# Altium schematic symbol library Capacitor - Aluminium TH.SchLib: 4591 symbols (part 14 of 27) (continued)
## UBT1C471MPD1TD (continued)
CAP ALUM 470UF 20% 16V RADIAL; Part Number: UBT1C471MPD1TD; Manufacturer: Nichicon; TemperatureRange: -40C ~ 125C; Type: Polar; Ripple Current: 472.5mA @ 120Hz; Impedance: 75 mOhm; Value: 470uF; PartId: 25469; Supplier 1: Digi-Key; Supplier Part Number 1: 493-4493-3-ND; ComponentLink1Description: Datasheet; ComponentLink1URL: http://nichicon-us.com/english/products/pdfs/e-ubt.pdf; ComponentLink2Description: Digi-Key Listing; ComponentLink2URL: https://www.digikey.com/product-detail/en/nichicon/UBT1C471MPD1TD/493-4493-3-ND/2649081; Tolerance: 20%; Voltage: 16V; Price: 0.2861; Device Package: Radial, Can, 10mm
footprint CAP AL TH D10 L5 H22
pins: 1, 2

## UBT1E102MHD1TO
designator C?, comment 1000uF  (value not drawn)
CAP ALUM 1000UF 20% 25V RADIAL; Part Number: UBT1E102MHD1TO; Manufacturer: Nichicon; TemperatureRange: -40C ~ 125C; Type: Polar; Ripple Current: 1.172A @ 120Hz; Impedance: 33 mOhm; Value: 1000uF; PartId: 23847; Supplier 1: Digi-Key; Supplier Part Number 1: 493-4500-3-ND; ComponentLink1Description: Datasheet; ComponentLink1URL: http://nichicon-us.com/english/products/pdfs/e-ubt.pdf; ComponentLink2Description: Digi-Key Listing; ComponentLink2URL: https://www.digikey.com/product-detail/en/nichicon/UBT1E102MHD1TO/493-4500-3-ND/2649088; Tolerance: 20%; Voltage: 25V; Price: 0.5684; Device Package: Radial, Can, 12.5mm
footprint CAP AL TH D12.5 L5 H27
pins: 1, 2

## UBT1E222MHD
designator C?, comment 2200uF  (value not drawn)
CAP ALUM 2200UF 20% 25V RADIAL; Part Number: UBT1E222MHD; Manufacturer: Nichicon; TemperatureRange: -40C ~ 125C; Type: Polar; Ripple Current: 1.816A @ 120Hz; Impedance: 20 mOhm; Value: 2200uF; PartId: 27192; Supplier 1: Digi-Key; Supplier Part Number 1: 493-4484-ND; ComponentLink1Description: Datasheet; ComponentLink1URL: http://nichicon-us.com/english/products/pdfs/e-ubt.pdf; ComponentLink2Description: Digi-Key Listing; ComponentLink2URL: https://www.digikey.com/product-detail/en/nichicon/UBT1E222MHD/493-4484-ND/2597401; Tolerance: 20%; Voltage: 25V; Price: 2.05; Device Package: Radial, Can, 16mm
footprint CAP AL TH D16 L7.5 H33.5
pins: 1, 2

## UBT1E331MPD1TD
designator C?, comment 330uF  (value not drawn)
CAP ALUM 330UF 20% 25V RADIAL; Part Number: UBT1E331MPD1TD; Manufacturer: Nichicon; TemperatureRange: -40C ~ 125C; Type: Polar; Ripple Current: 472.5mA @ 120Hz; Impedance: 75 mOhm; Value: 330uF; PartId: 25467; Supplier 1: Digi-Key; Supplier Part Number 1: 493-4498-3-ND; ComponentLink1Description: Datasheet; ComponentLink1URL: http://nichicon-us.com/english/products/pdfs/e-ubt.pdf; ComponentLink2Description: Digi-Key Listing; ComponentLink2URL: https://www.digikey.com/product-detail/en/nichicon/UBT1E331MPD1TD/493-4498-3-ND/2649086; Tolerance: 20%; Voltage: 25V; Price: 0.2698; Device Package: Radial, Can, 10mm
footprint CAP AL TH D10 L5 H22
pins: 1, 2

## UBT1E471MPD1TD
designator C?, comment 470uF  (value not drawn)
CAP ALUM 470UF 20% 25V RADIAL; Part Number: UBT1E471MPD1TD; Manufacturer: Nichicon; TemperatureRange: -40C ~ 125C; Type: Polar; Ripple Current: 550mA @ 120Hz; Impedance: 57 mOhm; Value: 470uF; PartId: 25813; Supplier 1: Digi-Key; Supplier Part Number 1: 493-4499-3-ND; ComponentLink1Description: Datasheet; ComponentLink1URL: http://nichicon-us.com/english/products/pdfs/e-ubt.pdf; ComponentLink2Description: Digi-Key Listing; ComponentLink2URL: https://www.digikey.com/product-detail/en/nichicon/UBT1E471MPD1TD/493-4499-3-ND/2649087; Tolerance: 20%; Voltage: 25V; Price: 0.3319; Device Package: Radial, Can, 10mm
footprint CAP AL TH D10 L5 H22
pins: 1, 2

## UBT1H101MPD1TD
designator C?, comment 100uF  (value not drawn)
CAP ALUM 100UF 20% 50V RADIAL; Part Number: UBT1H101MPD1TD; Manufacturer: Nichicon; TemperatureRange: -40C ~ 125C; Type: Polar; Ripple Current: 277.5mA @ 120Hz; Impedance: 180 mOhm; Value: 100uF; PartId: 24652; Supplier 1: Digi-Key; Supplier Part Number 1: 493-4508-3-ND; ComponentLink1Description: Datasheet; ComponentLink1URL: http://nichicon-us.com/english/products/pdfs/e-ubt.pdf; ComponentLink2Description: Digi-Key Listing; ComponentLink2URL: https://www.digikey.com/product-detail/en/nichicon/UBT1H101MPD1TD/493-4508-3-ND/2649096; Tolerance: 20%; Voltage: 50V; Price: 0.2558; Device Package: Radial, Can, 10mm
footprint CAP AL TH D10 L5 H14.5
pins: 1, 2

## UBT1H221MPD
designator C?, comment 220uF  (value not drawn)
CAP ALUM 220UF 20% 50V RADIAL; Part Number: UBT1H221MPD; Manufacturer: Nichicon; TemperatureRange: -40C ~ 125C; Type: Polar; Ripple Current: 465mA @ 120Hz; Impedance: 98 mOhm; Value: 220uF; PartId: 25962; Supplier 1: Digi-Key; Supplier Part Number 1: 493-13385-ND; ComponentLink1Description: Datasheet; ComponentLink1URL: http://nichicon-us.com/english/products/pdfs/e-ubt.pdf; ComponentLink2Description: Digi-Key Listing; ComponentLink2URL: https://www.digikey.com/product-detail/en/nichicon/UBT1H221MPD/493-13385-ND/2597410; Tolerance: 20%; Voltage: 50V; Price: 0.83; Device Package: Radial, Can, 10mm
footprint CAP AL TH D10 L5 H22
pins: 1, 2

## UBT1H221MPD1TD
designator C?, comment 220uF  (value not drawn)
CAP ALUM 220UF 20% 50V RADIAL; Part Number: UBT1H221MPD1TD; Manufacturer: Nichicon; TemperatureRange: -40C ~ 125C; Type: Polar; Ripple Current: 465mA @ 120Hz; Impedance: 98 mOhm; Value: 220uF; PartId: 25828; Supplier 1: Digi-Key; Supplier Part Number 1: 493-13101-3-ND; ComponentLink1Description: Datasheet; ComponentLink1URL: http://nichicon-us.com/english/products/pdfs/e-ubt.pdf; ComponentLink2Description: Digi-Key Listing; ComponentLink2URL: https://www.digikey.com/product-detail/en/nichicon/UBT1H221MPD1TD/493-13101-3-ND/4332732; Tolerance: 20%; Voltage: 50V; Price: 0.3475; Device Package: Radial, Can, 10mm
footprint CAP AL TH D10 L5 H22
pins: 1, 2

## UBT1H331MHD
designator C?, comment 330uF  (value not drawn)
CAP ALUM 330UF 20% 50V RADIAL; Part Number: UBT1H331MHD; Manufacturer: Nichicon; TemperatureRange: -40C ~ 125C; Type: Polar; Ripple Current: 665mA @ 120Hz; Impedance: 70 mOhm; Value: 330uF; PartId: 23403; Supplier 1: Digi-Key; Supplier Part Number 1: 493-14457-ND; ComponentLink1Description: Datasheet; ComponentLink1URL: http://nichicon-us.com/english/products/pdfs/e-ubt.pdf; ComponentLink2Description: Digi-Key Listing; ComponentLink2URL: https://www.digikey.com/product-detail/en/nichicon/UBT1H331MHD/493-14457-ND/2597412; Tolerance: 20%; Voltage: 50V; Price: 0.98; Device Package: Radial, Can, 12.5mm
footprint CAP AL TH D12.5 L5 H22
pins: 1, 2

## UBT1H331MHD1TO
designator C?, comment 330uF  (value not drawn)
CAP ALUM 330UF 20% 50V RADIAL; Part Number: UBT1H331MHD1TO; Manufacturer: Nichicon; TemperatureRange: -40C ~ 125C; Type: Polar; Ripple Current: 665mA @ 120Hz; Impedance: 70 mOhm; Value: 330uF; PartId: 23188; Supplier 1: Digi-Key; Supplier Part Number 1: 493-4509-3-ND; ComponentLink1Description: Datasheet; ComponentLink1URL: http://nichicon-us.com/english/products/pdfs/e-ubt.pdf; ComponentLink2Description: Digi-Key Listing; ComponentLink2URL: https://www.digikey.com/product-detail/en/nichicon/UBT1H331MHD1TO/493-4509-3-ND/2649097; Tolerance: 20%; Voltage: 50V; Price: 0.4367; Device Package: Radial, Can, 12.5mm
footprint CAP AL TH D12.5 L5 H22
pins: 1, 2

## UBT1H471MHD1TO
designator C?, comment 470uF  (value not drawn)
CAP ALUM 470UF 20% 50V RADIAL; Part Number: UBT1H471MHD1TO; Manufacturer: Nichicon; TemperatureRange: -40C ~ 125C; Type: Polar; Ripple Current: 825mA @ 120Hz; Impedance: 55 mOhm; Value: 470uF; PartId: 23858; Supplier 1: Digi-Key; Supplier Part Number 1: 493-4510-3-ND; ComponentLink1Description: Datasheet; ComponentLink1URL: http://nichicon-us.com/english/products/pdfs/e-ubt.pdf; ComponentLink2Description: Digi-Key Listing; ComponentLink2URL: https://www.digikey.com/product-detail/en/nichicon/UBT1H471MHD1TO/493-4510-3-ND/2649098; Tolerance: 20%; Voltage: 50V; Price: 0.6509; Device Package: Radial, Can, 12.5mm
footprint CAP AL TH D12.5 L5 H27
pins: 1, 2

## UBT1H471MNYGNACV
designator C?, comment 470uF  (value not drawn)
CAP ALUM 470UF 20% 50V RADIAL; Part Number: UBT1H471MNYGNACV; Manufacturer: Nichicon; TemperatureRange: -40C ~ 125C; Type: Polar; Ripple Current: 825mA @ 120Hz; Impedance: 55 mOhm; Value: 470uF; PartId: 24120; Supplier 1: Digi-Key; Supplier Part Number 1: UBT1H471MNYGNACV-ND; ComponentLink1Description: Datasheet; ComponentLink1URL: http://nichicon-us.com/english/products/pdfs/e-ubt.pdf; ComponentLink2Description: Digi-Key Listing; ComponentLink2URL: https://www.digikey.com/product-detail/en/nichicon/UBT1H471MNYGNACV/UBT1H471MNYGNACV-ND/5080522; Tolerance: 20%; Voltage: 50V; Price: 1.41; Device Package: Radial, Can, 12.5mm
footprint CAP AL TH D12.5 L5 H27
pins: 1, 2

## UBT1J101MPD1TD
designator C?, comment 100uF  (value not drawn)
CAP ALUM 100UF 20% 63V RADIAL; Part Number: UBT1J101MPD1TD; Manufacturer: Nichicon; TemperatureRange: -40C ~ 125C; Type: Polar; Ripple Current: 345mA @ 120Hz; Impedance: 410 mOhm; Value: 100uF; PartId: 25475; Supplier 1: Digi-Key; Supplier Part Number 1: 493-13105-3-ND; ComponentLink1Description: Datasheet; ComponentLink1URL: http://nichicon-us.com/english/products/pdfs/e-ubt.pdf; ComponentLink2Description: Digi-Key Listing; ComponentLink2URL: https://www.digikey.com/product-detail/en/nichicon/UBT1J101MPD1TD/493-13105-3-ND/4332736; Tolerance: 20%; Voltage: 63V; Price: 0.3061; Device Package: Radial, Can, 10mm
footprint CAP AL TH D10 L5 H22
pins: 1, 2

## UBT1J221MHD1TO
designator C?, comment 220uF  (value not drawn)
CAP ALUM 220UF 20% 63V RADIAL; Part Number: UBT1J221MHD1TO; Manufacturer: Nichicon; TemperatureRange: -40C ~ 125C; Type: Polar; Ripple Current: 525mA @ 120Hz; Impedance: 160 mOhm; Value: 220uF; PartId: 23195; Supplier 1: Digi-Key; Supplier Part Number 1: 493-4513-3-ND; ComponentLink1Description: Datasheet; ComponentLink1URL: http://nichicon-us.com/english/products/pdfs/e-ubt.pdf; ComponentLink2Description: Digi-Key Listing; ComponentLink2URL: https://www.digikey.com/product-detail/en/nichicon/UBT1J221MHD1TO/493-4513-3-ND/2649101; Tolerance: 20%; Voltage: 63V; Price: 0.4386; Device Package: Radial, Can, 12.5mm
footprint CAP AL TH D12.5 L5 H22
pins: 1, 2

## UBT1J331MHD1TO
designator C?, comment 330uF  (value not drawn)
CAP ALUM 330UF 20% 63V RADIAL; Part Number: UBT1J331MHD1TO; Manufacturer: Nichicon; TemperatureRange: -40C ~ 125C; Type: Polar; Ripple Current: 645mA @ 120Hz; Impedance: 120 mOhm; Value: 330uF; PartId: 24155; Supplier 1: Digi-Key; Supplier Part Number 1: 493-13107-1-ND; ComponentLink1Description: Datasheet; ComponentLink1URL: http://nichicon-us.com/english/products/pdfs/e-ubt.pdf; ComponentLink2Description: Digi-Key Listing; ComponentLink2URL: https://www.digikey.com/product-detail/en/nichicon/UBT1J331MHD1TO/493-13107-1-ND/4333117; Tolerance: 20%; Voltage: 63V; Price: 1.56; Device Package: Radial, Can, 12.5mm
footprint CAP AL TH D12.5 L5 H27
pins: 1, 2

## UBT1J470MPD1TD
designator C?, comment 47uF  (value not drawn)
CAP ALUM 47UF 20% 63V RADIAL; Part Number: UBT1J470MPD1TD; Manufacturer: Nichicon; TemperatureRange: -40C ~ 125C; Type: Polar; Ripple Current: 265mA @ 120Hz; Impedance: 590 mOhm; Value: 47uF; PartId: 24659; Supplier 1: Digi-Key; Supplier Part Number 1: 493-4512-3-ND; ComponentLink1Description: Datasheet; ComponentLink1URL: http://nichicon-us.com/english/products/pdfs/e-ubt.pdf; ComponentLink2Description: Digi-Key Listing; ComponentLink2URL: https://www.digikey.com/product-detail/en/nichicon/UBT1J470MPD1TD/493-4512-3-ND/2649100; Tolerance: 20%; Voltage: 63V; Price: 0.2591; Device Package: Radial, Can, 10mm
footprint CAP AL TH D10 L5 H14.5
pins: 1, 2

## UBT1J471MHD
designator C?, comment 470uF  (value not drawn)
CAP ALUM 470UF 20% 63V RADIAL; Part Number: UBT1J471MHD; Manufacturer: Nichicon; TemperatureRange: -40C ~ 125C; Type: Polar; Ripple Current: 730mA @ 120Hz; Impedance: 97 mOhm; Value: 470uF; PartId: 24384; Supplier 1: Digi-Key; Supplier Part Number 1: 493-4481-ND; ComponentLink1Description: Datasheet; ComponentLink1URL: http://nichicon-us.com/english/products/pdfs/e-ubt.pdf; ComponentLink2Description: Digi-Key Listing; ComponentLink2URL: https://www.digikey.com/product-detail/en/nichicon/UBT1J471MHD/493-4481-ND/2597422; Tolerance: 20%; Voltage: 63V; Price: 1.71; Device Package: Radial, Can, 12.5mm
footprint CAP AL TH D12.5 L5 H35.5
pins: 1, 2

## UBT1K221MHD1TO
designator C?, comment 220uF  (value not drawn)
CAP ALUM 220UF 20% 80V RADIAL; Part Number: UBT1K221MHD1TO; Manufacturer: Nichicon; TemperatureRange: -40C ~ 125C; Type: Polar; Ripple Current: 620mA @ 120Hz; Impedance: 180 mOhm; Value: 220uF; PartId: 23860; Supplier 1: Digi-Key; Supplier Part Number 1: 493-4514-3-ND; ComponentLink1Description: Datasheet; ComponentLink1URL: http://nichicon-us.com/english/products/pdfs/e-ubt.pdf; ComponentLink2Description: Digi-Key Listing; ComponentLink2URL: https://www.digikey.com/product-detail/en/nichicon/UBT1K221MHD1TO/493-4514-3-ND/2649102; Tolerance: 20%; Voltage: 80V; Price: 0.6645; Device Package: Radial, Can, 12.5mm
footprint CAP AL TH D12.5 L5 H27
pins: 1, 2

## UBT1K331MHD
designator C?, comment 330uF  (value not drawn)
CAP ALUM 330UF 20% 80V RADIAL; Part Number: UBT1K331MHD; Manufacturer: Nichicon; TemperatureRange: -40C ~ 125C; Type: Polar; Ripple Current: 695mA @ 120Hz; Impedance: 160 mOhm; Value: 330uF; PartId: 24391; Supplier 1: Digi-Key; Supplier Part Number 1: 493-13034-ND; ComponentLink1Description: Datasheet; ComponentLink1URL: http://nichicon-us.com/english/products/pdfs/e-ubt.pdf; ComponentLink2Description: Digi-Key Listing; ComponentLink2URL: https://www.digikey.com/product-detail/en/nichicon/UBT1K331MHD/493-13034-ND/2597427; Tolerance: 20%; Voltage: 80V; Price: 1.81; Device Package: Radial, Can, 12.5mm
footprint CAP AL TH D12.5 L5 H35.5
pins: 1, 2

## UBT1K471MHD1TN
designator C?, comment 470uF  (value not drawn)
CAP ALUM 470UF 20% 80V RADIAL; Part Number: UBT1K471MHD1TN; Manufacturer: Nichicon; TemperatureRange: -40C ~ 125C; Type: Polar; Ripple Current: 750mA @ 120Hz; Impedance: 110 mOhm; Value: 470uF; PartId: 26880; Supplier 1: Digi-Key; Supplier Part Number 1: 493-4515-3-ND; ComponentLink1Description: Datasheet; ComponentLink1URL: http://nichicon-us.com/english/products/pdfs/e-ubt.pdf; ComponentLink2Description: Digi-Key Listing; ComponentLink2URL: https://www.digikey.com/product-detail/en/nichicon/UBT1K471MHD1TN/493-4515-3-ND/2649103; Tolerance: 20%; Voltage: 80V; Price: 1.3037; Device Package: Radial, Can, 16mm
footprint CAP AL TH D16 L7.5 H27
pins: 1, 2

## UBT1K471MNDDCTCC
designator C?, comment 470uF  (value not drawn)
CAP ALUM 470UF 20% 80V RADIAL; Part Number: UBT1K471MNDDCTCC; Manufacturer: Nichicon; TemperatureRange: -40C ~ 125C; Type: Polar; Ripple Current: 750mA @ 120Hz; Impedance: 110 mOhm; Value: 470uF; PartId: 26682; Supplier 1: Digi-Key; Supplier Part Number 1: 493-14668-ND; ComponentLink1Description: Datasheet; ComponentLink1URL: //media.digikey.com/pdf/Data%20Sheets/Nichicon%20PDFs/UBT1K471MNDDCTCC_Spec_Sheet.pdf; ComponentLink2Description: Digi-Key Listing; ComponentLink2URL: https://www.digikey.com/product-detail/en/nichicon/UBT1K471MNDDCTCC/493-14668-ND/5994796; Tolerance: 20%; Voltage: 80V; Price: 1.8; Device Package: Radial, Can, 16mm
footprint CAP AL TH D16 L7.5 H26.5
pins: 1, 2

## UBT1V101MPD1TD
designator C?, comment 100uF  (value not drawn)
CAP ALUM 100UF 20% 35V RADIAL; Part Number: UBT1V101MPD1TD; Manufacturer: Nichicon; TemperatureRange: -40C ~ 125C; Type: Polar; Ripple Current: 310mA @ 120Hz; Impedance: 150 mOhm; Value: 100uF; PartId: 24650; Supplier 1: Digi-Key; Supplier Part Number 1: 493-4501-3-ND; ComponentLink1Description: Datasheet; ComponentLink1URL: http://nichicon-us.com/english/products/pdfs/e-ubt.pdf; ComponentLink2Description: Digi-Key Listing; ComponentLink2URL: https://www.digikey.com/product-detail/en/nichicon/UBT1V101MPD1TD/493-4501-3-ND/2649089; Tolerance: 20%; Voltage: 35V; Price: 0.253; Device Package: Radial, Can, 10mm
footprint CAP AL TH D10 L5 H14.5
pins: 1, 2

## UBT1V102MHD1TN
designator C?, comment 1000uF  (value not drawn)
CAP ALUM 1000UF 20% 35V RADIAL; Part Number: UBT1V102MHD1TN; Manufacturer: Nichicon; TemperatureRange: -40C ~ 125C; Type: Polar; Ripple Current: 1.347A @ 120Hz; Impedance: 31 mOhm; Value: 1000uF; PartId: 26840; Supplier 1: Digi-Key; Supplier Part Number 1: 493-4504-3-ND; ComponentLink1Description: Datasheet; ComponentLink1URL: http://nichicon-us.com/english/products/pdfs/e-ubt.pdf; ComponentLink2Description: Digi-Key Listing; ComponentLink2URL: https://www.digikey.com/product-detail/en/nichicon/UBT1V102MHD1TN/493-4504-3-ND/2649092; Tolerance: 20%; Voltage: 35V; Price: 0.9972; Device Package: Radial, Can, 16mm
footprint CAP AL TH D16 L7.5 H27
pins: 1, 2

## UBT1V221MPD
designator C?, comment 220uF  (value not drawn)
CAP ALUM 220UF 20% 35V RADIAL; Part Number: UBT1V221MPD; Manufacturer: Nichicon; TemperatureRange: -40C ~ 125C; Type: Polar; Ripple Current: 395mA @ 120Hz; Impedance: 94 mOhm; Value: 220uF; PartId: 25633; Supplier 1: Digi-Key; Supplier Part Number 1: 493-13386-ND; ComponentLink1Description: Datasheet; ComponentLink1URL: http://nichicon-us.com/english/products/pdfs/e-ubt.pdf; ComponentLink2Description: Digi-Key Listing; ComponentLink2URL: https://www.digikey.com/product-detail/en/nichicon/UBT1V221MPD/493-13386-ND/2597432; Tolerance: 20%; Voltage: 35V; Price: 0.72; Device Package: Radial, Can, 10mm
footprint CAP AL TH D10 L5 H22
pins: 1, 2

## UBT1V221MPD1TD
designator C?, comment 220uF  (value not drawn)
CAP ALUM 220UF 20% 35V RADIAL; Part Number: UBT1V221MPD1TD; Manufacturer: Nichicon; TemperatureRange: -40C ~ 125C; Type: Polar; Ripple Current: 395mA @ 120Hz; Impedance: 94 mOhm; Value: 220uF; PartId: 25468; Supplier 1: Digi-Key; Supplier Part Number 1: 493-4502-3-ND; ComponentLink1Description: Datasheet; ComponentLink1URL: http://nichicon-us.com/english/products/pdfs/e-ubt.pdf; ComponentLink2Description: Digi-Key Listing; ComponentLink2URL: https://www.digikey.com/product-detail/en/nichicon/UBT1V221MPD1TD/493-4502-3-ND/2649090; Tolerance: 20%; Voltage: 35V; Price: 0.2736; Device Package: Radial, Can, 10mm
footprint CAP AL TH D10 L5 H22
pins: 1, 2

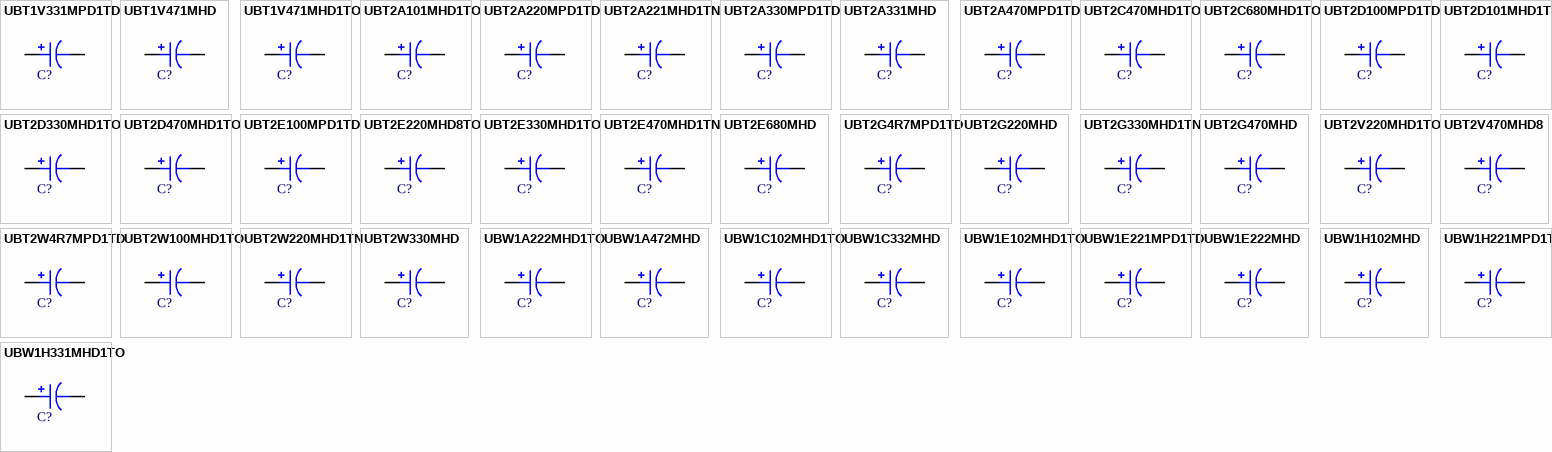
[diagram p59: symbols UBT1V331MPD1TD to UBW1H331MHD1TO]

## UBT1V331MPD1TD
designator C?, comment 330uF  (value not drawn)
CAP ALUM 330UF 20% 35V RADIAL; Part Number: UBT1V331MPD1TD; Manufacturer: Nichicon; TemperatureRange: -40C ~ 125C; Type: Polar; Ripple Current: 475mA @ 120Hz; Impedance: 75 mOhm; Value: 330uF; PartId: 25823; Supplier 1: Digi-Key; Supplier Part Number 1: 493-13112-3-ND; ComponentLink1Description: Datasheet; ComponentLink1URL: http://nichicon-us.com/english/products/pdfs/e-ubt.pdf; ComponentLink2Description: Digi-Key Listing; ComponentLink2URL: https://www.digikey.com/product-detail/en/nichicon/UBT1V331MPD1TD/493-13112-3-ND/4332743; Tolerance: 20%; Voltage: 35V; Price: 0.341; Device Package: Radial, Can, 10mm
footprint CAP AL TH D10 L5 H22
pins: 1, 2

## UBT1V471MHD
designator C?, comment 470uF  (value not drawn)
CAP ALUM 470UF 20% 35V RADIAL; Part Number: UBT1V471MHD; Manufacturer: Nichicon; TemperatureRange: -40C ~ 125C; Type: Polar; Ripple Current: 665mA @ 120Hz; Impedance: 58 mOhm; Value: 470uF; PartId: 23463; Supplier 1: Digi-Key; Supplier Part Number 1: 493-14458-ND; ComponentLink1Description: Datasheet; ComponentLink1URL: http://nichicon-us.com/english/products/pdfs/e-ubt.pdf; ComponentLink2Description: Digi-Key Listing; ComponentLink2URL: https://www.digikey.com/product-detail/en/nichicon/UBT1V471MHD/493-14458-ND/2597435; Tolerance: 20%; Voltage: 35V; Price: 1.06; Device Package: Radial, Can, 12.5mm
footprint CAP AL TH D12.5 L5 H22
pins: 1, 2

## UBT1V471MHD1TO
designator C?, comment 470uF  (value not drawn)
CAP ALUM 470UF 20% 35V RADIAL; Part Number: UBT1V471MHD1TO; Manufacturer: Nichicon; TemperatureRange: -40C ~ 125C; Type: Polar; Ripple Current: 665mA @ 120Hz; Impedance: 58 mOhm; Value: 470uF; PartId: 23204; Supplier 1: Digi-Key; Supplier Part Number 1: 493-4503-3-ND; ComponentLink1Description: Datasheet; ComponentLink1URL: http://nichicon-us.com/english/products/pdfs/e-ubt.pdf; ComponentLink2Description: Digi-Key Listing; ComponentLink2URL: https://www.digikey.com/product-detail/en/nichicon/UBT1V471MHD1TO/493-4503-3-ND/2649091; Tolerance: 20%; Voltage: 35V; Price: 0.4724; Device Package: Radial, Can, 12.5mm
footprint CAP AL TH D12.5 L5 H22
pins: 1, 2

## UBT2A101MHD1TO
designator C?, comment 100uF  (value not drawn)
CAP ALUM 100UF 20% 100V RADIAL; Part Number: UBT2A101MHD1TO; Manufacturer: Nichicon; TemperatureRange: -40C ~ 125C; Type: Polar; Ripple Current: 495mA @ 120Hz; Impedance: 250 mOhm; Value: 100uF; PartId: 23189; Supplier 1: Digi-Key; Supplier Part Number 1: 493-13114-3-ND; ComponentLink1Description: Datasheet; ComponentLink1URL: http://nichicon-us.com/english/products/pdfs/e-ubt.pdf; ComponentLink2Description: Digi-Key Listing; ComponentLink2URL: https://www.digikey.com/product-detail/en/nichicon/UBT2A101MHD1TO/493-13114-3-ND/4332745; Tolerance: 20%; Voltage: 100V; Price: 0.4367; Device Package: Radial, Can, 12.5mm
footprint CAP AL TH D12.5 L5 H22
pins: 1, 2

## UBT2A220MPD1TD
designator C?, comment 22uF  (value not drawn)
CAP ALUM 22UF 20% 100V RADIAL; Part Number: UBT2A220MPD1TD; Manufacturer: Nichicon; TemperatureRange: -40C ~ 125C; Type: Polar; Ripple Current: 240mA  @ 120Hz; Impedance: 800 mOhm; Value: 22uF; PartId: 24644; Supplier 1: Digi-Key; Supplier Part Number 1: 493-4516-3-ND; ComponentLink1Description: Datasheet; ComponentLink1URL: http://nichicon-us.com/english/products/pdfs/e-ubt.pdf; ComponentLink2Description: Digi-Key Listing; ComponentLink2URL: https://www.digikey.com/product-detail/en/nichicon/UBT2A220MPD1TD/493-4516-3-ND/2649104; Tolerance: 20%; Voltage: 100V; Price: 0.2476; Device Package: Radial, Can, 10mm
footprint CAP AL TH D10 L5 H14.5
pins: 1, 2

## UBT2A221MHD1TN
designator C?, comment 220uF  (value not drawn)
CAP ALUM 220UF 20% 100V RADIAL; Part Number: UBT2A221MHD1TN; Manufacturer: Nichicon; TemperatureRange: -40C ~ 125C; Type: Polar; Ripple Current: 750mA @ 120Hz; Impedance: 110 mOhm; Value: 220uF; PartId: 26837; Supplier 1: Digi-Key; Supplier Part Number 1: 493-4517-3-ND; ComponentLink1Description: Datasheet; ComponentLink1URL: http://nichicon-us.com/english/products/pdfs/e-ubt.pdf; ComponentLink2Description: Digi-Key Listing; ComponentLink2URL: https://www.digikey.com/product-detail/en/nichicon/UBT2A221MHD1TN/493-4517-3-ND/2649105; Tolerance: 20%; Voltage: 100V; Price: 0.9882; Device Package: Radial, Can, 16mm
footprint CAP AL TH D16 L7.5 H27
pins: 1, 2

## UBT2A330MPD1TD
designator C?, comment 33uF  (value not drawn)
CAP ALUM 33UF 20% 100V RADIAL; Part Number: UBT2A330MPD1TD; Manufacturer: Nichicon; TemperatureRange: -40C ~ 125C; Type: Polar; Ripple Current: 240mA  @ 120Hz; Impedance: 800 mOhm; Value: 33uF; PartId: 24664; Supplier 1: Digi-Key; Supplier Part Number 1: 493-13115-3-ND; ComponentLink1Description: Datasheet; ComponentLink1URL: http://nichicon-us.com/english/products/pdfs/e-ubt.pdf; ComponentLink2Description: Digi-Key Listing; ComponentLink2URL: https://www.digikey.com/product-detail/en/nichicon/UBT2A330MPD1TD/493-13115-3-ND/4332746; Tolerance: 20%; Voltage: 100V; Price: 0.2724; Device Package: Radial, Can, 10mm
footprint CAP AL TH D10 L5 H14.5
pins: 1, 2

## UBT2A331MHD
designator C?, comment 330uF  (value not drawn)
CAP ALUM 330UF 20% 100V RADIAL; Part Number: UBT2A331MHD; Manufacturer: Nichicon; TemperatureRange: -40C ~ 125C; Type: Polar; Ripple Current: 895mA @ 120Hz; Impedance: 79 mOhm; Value: 330uF; PartId: 27244; Supplier 1: Digi-Key; Supplier Part Number 1: 493-13035-ND; ComponentLink1Description: Datasheet; ComponentLink1URL: http://nichicon-us.com/english/products/pdfs/e-ubt.pdf; ComponentLink2Description: Digi-Key Listing; ComponentLink2URL: https://www.digikey.com/product-detail/en/nichicon/UBT2A331MHD/493-13035-ND/2597441; Tolerance: 20%; Voltage: 100V; Price: 2.59; Device Package: Radial, Can, 16mm
footprint CAP AL TH D16 L7.5 H33.5
pins: 1, 2

## UBT2A470MPD1TD
designator C?, comment 47uF  (value not drawn)
CAP ALUM 47UF 20% 100V RADIAL; Part Number: UBT2A470MPD1TD; Manufacturer: Nichicon; TemperatureRange: -40C ~ 125C; Type: Polar; Ripple Current: 315mA @ 120Hz; Impedance: 550 mOhm; Value: 47uF; PartId: 25474; Supplier 1: Digi-Key; Supplier Part Number 1: 493-13116-3-ND; ComponentLink1Description: Datasheet; ComponentLink1URL: http://nichicon-us.com/english/products/pdfs/e-ubt.pdf; ComponentLink2Description: Digi-Key Listing; ComponentLink2URL: https://www.digikey.com/product-detail/en/nichicon/UBT2A470MPD1TD/493-13116-3-ND/4332747; Tolerance: 20%; Voltage: 100V; Price: 0.2992; Device Package: Radial, Can, 10mm
footprint CAP AL TH D10 L5 H22
pins: 1, 2

## UBT2C470MHD1TO
designator C?, comment 47uF  (value not drawn)
CAP ALUM 47UF 20% 160V RADIAL; Part Number: UBT2C470MHD1TO; Manufacturer: Nichicon; TemperatureRange: -40C ~ 125C; Type: Polar; Ripple Current: 187mA @ 120Hz; Value: 47uF; PartId: 23498; Supplier 1: Digi-Key; Supplier Part Number 1: 493-4518-1-ND; ComponentLink1Description: Datasheet; ComponentLink1URL: http://nichicon-us.com/english/products/pdfs/e-ubt.pdf; ComponentLink2Description: Digi-Key Listing; ComponentLink2URL: https://www.digikey.com/product-detail/en/nichicon/UBT2C470MHD1TO/493-4518-1-ND/2650358; Tolerance: 20%; Voltage: 160V; Price: 1.21; Device Package: Radial, Can, 12.5mm
footprint CAP AL TH D12.5 L5 H22
pins: 1, 2

## UBT2C680MHD1TO
designator C?, comment 68uF  (value not drawn)
CAP ALUM 68UF 20% 160V RADIAL; Part Number: UBT2C680MHD1TO; Manufacturer: Nichicon; TemperatureRange: -40C ~ 125C; Type: Polar; Ripple Current: 245mA @ 120Hz; Value: 68uF; PartId: 24164; Supplier 1: Digi-Key; Supplier Part Number 1: 493-13121-1-ND; ComponentLink1Description: Datasheet; ComponentLink1URL: http://nichicon-us.com/english/products/pdfs/e-ubt.pdf; ComponentLink2Description: Digi-Key Listing; ComponentLink2URL: https://www.digikey.com/product-detail/en/nichicon/UBT2C680MHD1TO/493-13121-1-ND/4333131; Tolerance: 20%; Voltage: 160V; Price: 1.62; Device Package: Radial, Can, 12.5mm
footprint CAP AL TH D12.5 L5 H27
pins: 1, 2

## UBT2D100MPD1TD
designator C?, comment 10uF  (value not drawn)
CAP ALUM 10UF 20% 200V RADIAL; Part Number: UBT2D100MPD1TD; Manufacturer: Nichicon; TemperatureRange: -40C ~ 125C; Type: Polar; Ripple Current: 78mA @ 120Hz; Value: 10uF; PartId: 25822; Supplier 1: Digi-Key; Supplier Part Number 1: 493-13122-3-ND; ComponentLink1Description: Datasheet; ComponentLink1URL: http://nichicon-us.com/english/products/pdfs/e-ubt.pdf; ComponentLink2Description: Digi-Key Listing; ComponentLink2URL: https://www.digikey.com/product-detail/en/nichicon/UBT2D100MPD1TD/493-13122-3-ND/4332753; Tolerance: 20%; Voltage: 200V; Price: 0.341; Device Package: Radial, Can, 10mm
footprint CAP AL TH D10 L5 H22
pins: 1, 2

## UBT2D101MHD1TN
designator C?, comment 100uF  (value not drawn)
CAP ALUM 100UF 20% 200V RADIAL; Part Number: UBT2D101MHD1TN; Manufacturer: Nichicon; TemperatureRange: -40C ~ 125C; Type: Polar; Ripple Current: 329mA @ 120Hz; Value: 100uF; PartId: 26839; Supplier 1: Digi-Key; Supplier Part Number 1: 493-4519-3-ND; ComponentLink1Description: Datasheet; ComponentLink1URL: http://nichicon-us.com/english/products/pdfs/e-ubt.pdf; ComponentLink2Description: Digi-Key Listing; ComponentLink2URL: https://www.digikey.com/product-detail/en/nichicon/UBT2D101MHD1TN/493-4519-3-ND/2649107; Tolerance: 20%; Voltage: 200V; Price: 0.991; Device Package: Radial, Can, 16mm
footprint CAP AL TH D16 L7.5 H27
pins: 1, 2

## UBT2D330MHD1TO
designator C?, comment 33uF  (value not drawn)
CAP ALUM 33UF 20% 200V RADIAL; Part Number: UBT2D330MHD1TO; Manufacturer: Nichicon; TemperatureRange: -40C ~ 125C; Type: Polar; Ripple Current: 157mA @ 120Hz; Value: 33uF; PartId: 23502; Supplier 1: Digi-Key; Supplier Part Number 1: 493-13124-1-ND; ComponentLink1Description: Datasheet; ComponentLink1URL: http://nichicon-us.com/english/products/pdfs/e-ubt.pdf; ComponentLink2Description: Digi-Key Listing; ComponentLink2URL: https://www.digikey.com/product-detail/en/nichicon/UBT2D330MHD1TO/493-13124-1-ND/4333134; Tolerance: 20%; Voltage: 200V; Price: 1.25; Device Package: Radial, Can, 12.5mm
footprint CAP AL TH D12.5 L5 H22
pins: 1, 2

## UBT2D470MHD1TO
designator C?, comment 47uF  (value not drawn)
CAP ALUM 47UF 20% 200V RADIAL; Part Number: UBT2D470MHD1TO; Manufacturer: Nichicon; TemperatureRange: -40C ~ 125C; Type: Polar; Ripple Current: 204mA @ 120Hz; Value: 47uF; PartId: 24127; Supplier 1: Digi-Key; Supplier Part Number 1: 493-13125-1-ND; ComponentLink1Description: Datasheet; ComponentLink1URL: http://nichicon-us.com/english/products/pdfs/e-ubt.pdf; ComponentLink2Description: Digi-Key Listing; ComponentLink2URL: https://www.digikey.com/product-detail/en/nichicon/UBT2D470MHD1TO/493-13125-1-ND/4333135; Tolerance: 20%; Voltage: 200V; Price: 1.43; Device Package: Radial, Can, 12.5mm
footprint CAP AL TH D12.5 L5 H27
pins: 1, 2

## UBT2E100MPD1TD
designator C?, comment 10uF  (value not drawn)
CAP ALUM 10UF 20% 250V RADIAL; Part Number: UBT2E100MPD1TD; Manufacturer: Nichicon; TemperatureRange: -40C ~ 125C; Type: Polar; Ripple Current: 78mA @ 120Hz; Value: 10uF; PartId: 25824; Supplier 1: Digi-Key; Supplier Part Number 1: 493-13127-3-ND; ComponentLink1Description: Datasheet; ComponentLink1URL: http://nichicon-us.com/english/products/pdfs/e-ubt.pdf; ComponentLink2Description: Digi-Key Listing; ComponentLink2URL: https://www.digikey.com/product-detail/en/nichicon/UBT2E100MPD1TD/493-13127-3-ND/4332758; Tolerance: 20%; Voltage: 250V; Price: 0.341; Device Package: Radial, Can, 10mm
footprint CAP AL TH D10 L5 H22
pins: 1, 2

## UBT2E220MHD8TO
designator C?, comment 22uF  (value not drawn)
CAP ALUM 22UF 20% 250V RADIAL; Part Number: UBT2E220MHD8TO; Manufacturer: Nichicon; TemperatureRange: -40C ~ 125C; Type: Polar; Ripple Current: 128mA @ 120Hz; Value: 22uF; PartId: 23505; Supplier 1: Digi-Key; Supplier Part Number 1: 493-13128-1-ND; ComponentLink1Description: Datasheet; ComponentLink1URL: http://nichicon-us.com/english/products/pdfs/e-ubt.pdf; ComponentLink2Description: Digi-Key Listing; ComponentLink2URL: https://www.digikey.com/product-detail/en/nichicon/UBT2E220MHD8TO/493-13128-1-ND/4333138; Tolerance: 20%; Voltage: 250V; Price: 1.3; Device Package: Radial, Can, 12.5mm
footprint CAP AL TH D12.5 L5 H22
pins: 1, 2

## UBT2E330MHD1TO
designator C?, comment 33uF  (value not drawn)
CAP ALUM 33UF 20% 250V RADIAL; Part Number: UBT2E330MHD1TO; Manufacturer: Nichicon; TemperatureRange: -40C ~ 125C; Type: Polar; Ripple Current: 171mA @ 120Hz; Value: 33uF; PartId: 24143; Supplier 1: Digi-Key; Supplier Part Number 1: 493-13129-1-ND; ComponentLink1Description: Datasheet; ComponentLink1URL: http://nichicon-us.com/english/products/pdfs/e-ubt.pdf; ComponentLink2Description: Digi-Key Listing; ComponentLink2URL: https://www.digikey.com/product-detail/en/nichicon/UBT2E330MHD1TO/493-13129-1-ND/4333139; Tolerance: 20%; Voltage: 250V; Price: 1.48; Device Package: Radial, Can, 12.5mm
footprint CAP AL TH D12.5 L5 H27
pins: 1, 2

## UBT2E470MHD1TN
designator C?, comment 47uF  (value not drawn)
CAP ALUM 47UF 20% 250V RADIAL; Part Number: UBT2E470MHD1TN; Manufacturer: Nichicon; TemperatureRange: -40C ~ 125C; Type: Polar; Ripple Current: 225mA @ 120Hz; Value: 47uF; PartId: 26845; Supplier 1: Digi-Key; Supplier Part Number 1: 493-13130-3-ND; ComponentLink1Description: Datasheet; ComponentLink1URL: http://nichicon-us.com/english/products/pdfs/e-ubt.pdf; ComponentLink2Description: Digi-Key Listing; ComponentLink2URL: https://www.digikey.com/product-detail/en/nichicon/UBT2E470MHD1TN/493-13130-3-ND/4332761; Tolerance: 20%; Voltage: 250V; Price: 1.0364; Device Package: Radial, Can, 16mm
footprint CAP AL TH D16 L7.5 H27
pins: 1, 2

## UBT2E680MHD
designator C?, comment 68uF  (value not drawn)
CAP ALUM 68UF 20% 250V RADIAL; Part Number: UBT2E680MHD; Manufacturer: Nichicon; TemperatureRange: -40C ~ 125C; Type: Polar; Ripple Current: 292mA @ 120Hz; Value: 68uF; PartId: 27225; Supplier 1: Digi-Key; Supplier Part Number 1: 493-13037-ND; ComponentLink1Description: Datasheet; ComponentLink1URL: http://nichicon-us.com/english/products/pdfs/e-ubt.pdf; ComponentLink2Description: Digi-Key Listing; ComponentLink2URL: https://www.digikey.com/product-detail/en/nichicon/UBT2E680MHD/493-13037-ND/2597460; Tolerance: 20%; Voltage: 250V; Price: 2.36; Device Package: Radial, Can, 16mm
footprint CAP AL TH D16 L7.5 H33.5
pins: 1, 2

## UBT2G4R7MPD1TD
designator C?, comment 4.7uF  (value not drawn)
CAP ALUM 4.7UF 20% 400V RADIAL; Part Number: UBT2G4R7MPD1TD; Manufacturer: Nichicon; TemperatureRange: -25C ~ 125C; Type: Polar; Ripple Current: 53mA @ 120Hz; Value: 4.7uF; PartId: 25814; Supplier 1: Digi-Key; Supplier Part Number 1: 493-4521-3-ND; ComponentLink1Description: Datasheet; ComponentLink1URL: http://nichicon-us.com/english/products/pdfs/e-ubt.pdf; ComponentLink2Description: Digi-Key Listing; ComponentLink2URL: https://www.digikey.com/product-detail/en/nichicon/UBT2G4R7MPD1TD/493-4521-3-ND/2649109; Tolerance: 20%; Voltage: 400V; Price: 0.3328; Device Package: Radial, Can, 10mm
footprint CAP AL TH D10 L5 H22
pins: 1, 2

## UBT2G220MHD
designator C?, comment 22uF  (value not drawn)
CAP ALUM 22UF 20% 400V RADIAL; Part Number: UBT2G220MHD; Manufacturer: Nichicon; TemperatureRange: -25C ~ 125C; Type: Polar; Ripple Current: 142mA @ 120Hz; Value: 22uF; PartId: 24383; Supplier 1: Digi-Key; Supplier Part Number 1: 493-13038-ND; ComponentLink1Description: Datasheet; ComponentLink1URL: http://nichicon-us.com/english/products/pdfs/e-ubt.pdf; ComponentLink2Description: Digi-Key Listing; ComponentLink2URL: https://www.digikey.com/product-detail/en/nichicon/UBT2G220MHD/493-13038-ND/2597462; Tolerance: 20%; Voltage: 400V; Price: 1.7; Device Package: Radial, Can, 12.5mm
footprint CAP AL TH D12.5 L5 H35.5
pins: 1, 2